# Altium footprint library UWRT Footprint Library.PcbLib: 258 footprints (part 11 of 17)
Each footprint in its own frame and in the unit in brackets; x right, y up, seen from the top. Pads: shape width x height; smd on the part's side, far side on the other; paste and mask are expansions set on the pad; w line width, h text height; cw(c..) or ccw(c..) is an arc to the next point about the centre after c.
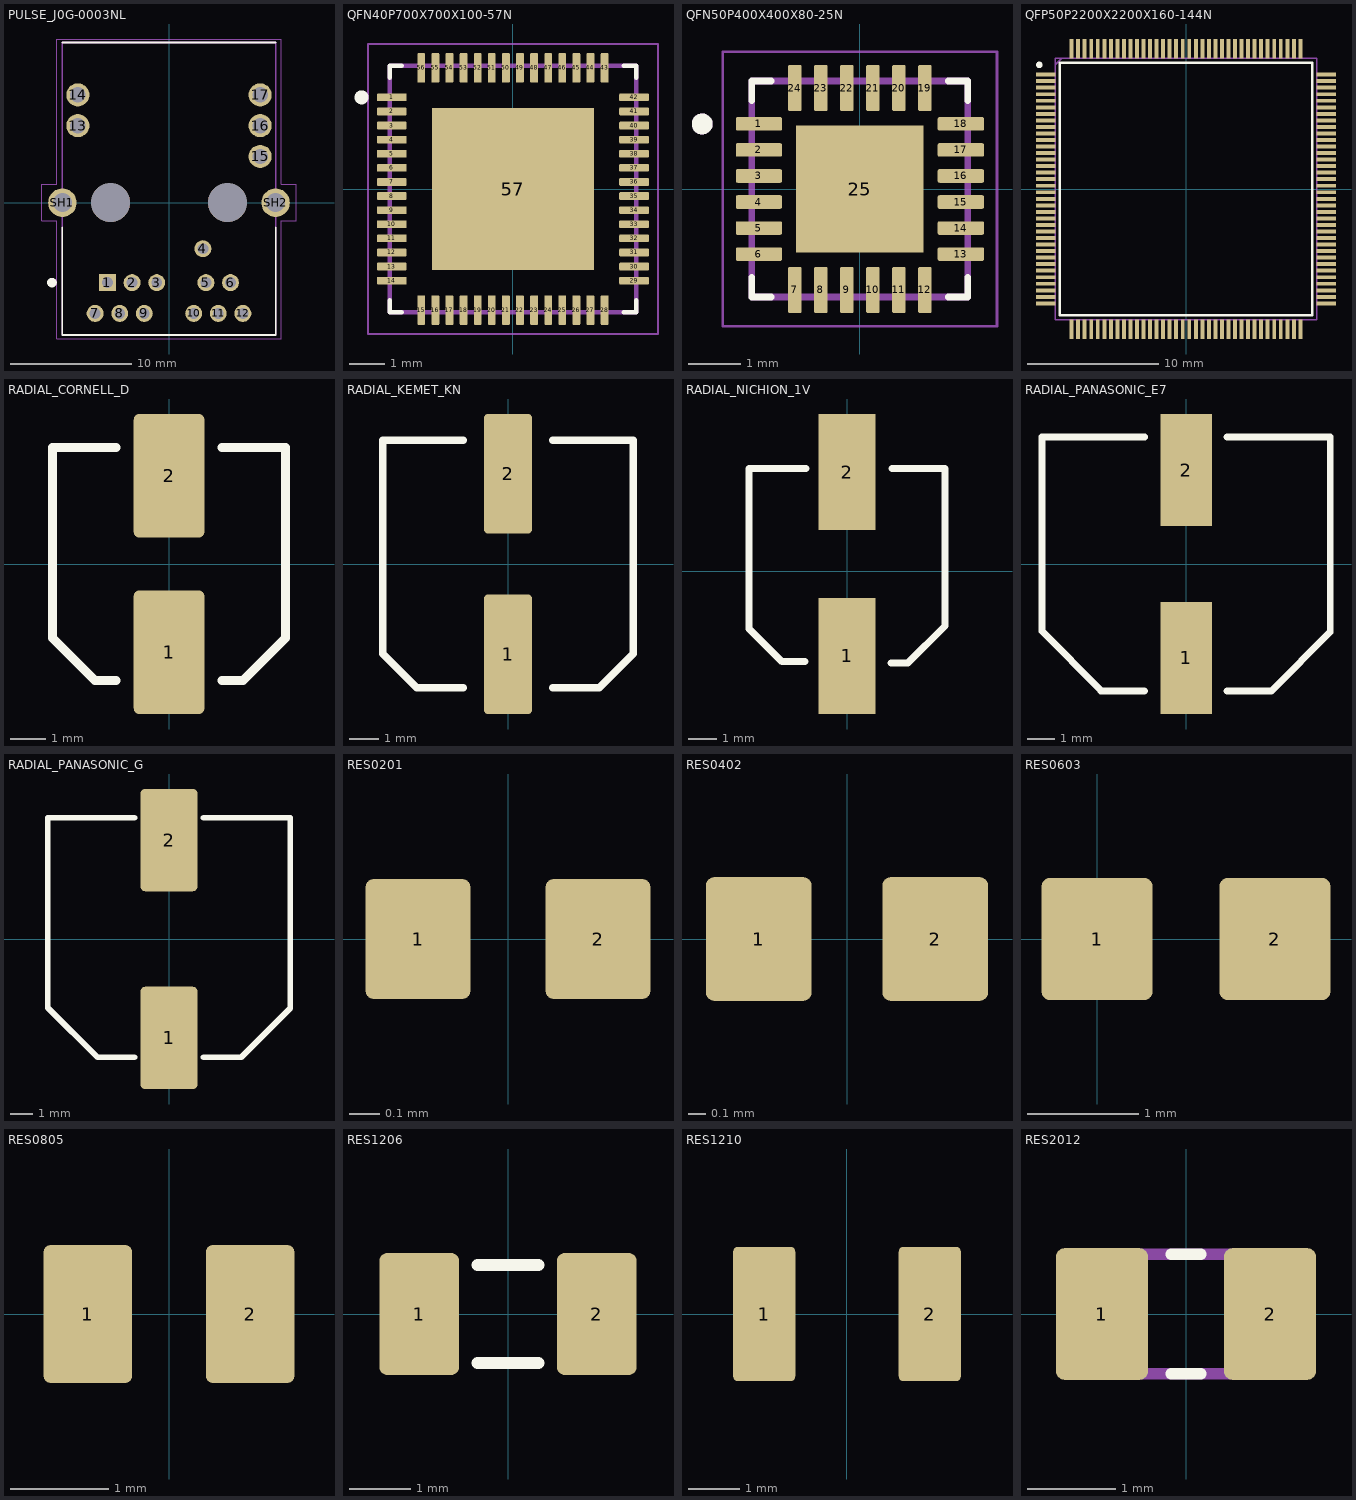
[diagram p10: the footprints below, top view; thin cyan lines are the x and y axes]

## PULSE_J0G-0003NL [mm]
pads (21):
  rect 1.398x1.398 hole 0.89: 1(-5.075,-6.6)
  round 1.398 hole 0.89: 2(-3.045,-6.6) 3(-1.015,-6.6) 4(2.8,-3.8) 5(3.045,-6.6) 6(5.075,-6.6) 7(-6.095,-9.14) 8(-4.065,-9.14) 9(-2.035,-9.14) 10(2.035,-9.14) 11(4.065,-9.14) 12(6.095,-9.14)
  round 1.905 hole 1.27: 13(-7.52,6.35) 14(-7.52,8.89) 15(7.52,3.81) 16(7.52,6.35) 17(7.52,8.89)
  round 2.355 hole 1.57: SH1(-8.79,0) SH2(8.79,0)
  round 3.2 hole 3.2 unplated: ""(-4.825,0) ""(4.825,0)
Top Overlay:
  circle w0.4: c-9.66,-6.6 r0.2
  lines w0.127: -8.79,-2.03 -8.79,-10.92 8.79,-10.92 8.79,-2.03 ; -8.79,13.21 8.79,13.21
Mechanical 13:
  lines w0.127: -8.79,-10.92 8.79,-10.92 8.79,13.21 -8.79,13.21 -8.79,-10.92
Mechanical 15:
  lines w0.05: -10.5,-1.5 -10.5,1.5 -9.25,1.5 -9.25,13.5 9.25,13.5 9.25,1.5 10.5,1.5 10.5,-1.5 9.25,-1.5 9.25,-11.25 -9.25,-11.25 -9.25,-1.5 -10.5,-1.5
3D body "J0G-0003NL--3DModel-STEP-1.STEP": height 11.31, standoff -3.55, extent -8.9,-10.58 9.08,13.98

## QFN40P700X700X100-57N [mm]
pads (57):
  rrect25% 0.84x0.22 smd: 1(-3.435,2.6) 2(-3.435,2.2) 3(-3.435,1.8) 4(-3.435,1.4) 5(-3.435,1) 6(-3.435,0.6) 7(-3.435,0.2) 8(-3.435,-0.2) 9(-3.435,-0.6) 10(-3.435,-1) 11(-3.435,-1.4) 12(-3.435,-1.8) 13(-3.435,-2.2) 14(-3.435,-2.6) 29(3.435,-2.6) 30(3.435,-2.2) 31(3.435,-1.8) 32(3.435,-1.4) 33(3.435,-1) 34(3.435,-0.6) 35(3.435,-0.2) 36(3.435,0.2) 37(3.435,0.6) 38(3.435,1) 39(3.435,1.4) 40(3.435,1.8) 41(3.435,2.2) 42(3.435,2.6)
  rrect25% 0.22x0.84 smd: 15(-2.6,-3.435) 16(-2.2,-3.435) 17(-1.8,-3.435) 18(-1.4,-3.435) 19(-1,-3.435) 20(-0.6,-3.435) 21(-0.2,-3.435) 22(0.2,-3.435) 23(0.6,-3.435) 24(1,-3.435) 25(1.4,-3.435) 26(1.8,-3.435) 27(2.2,-3.435) 28(2.6,-3.435) 43(2.6,3.435) 44(2.2,3.435) 45(1.8,3.435) 46(1.4,3.435) 47(1,3.435) 48(0.6,3.435) 49(0.2,3.435) 50(-0.2,3.435) 51(-0.6,3.435) 52(-1,3.435) 53(-1.4,3.435) 54(-1.8,3.435) 55(-2.2,3.435) 56(-2.6,3.435)
  rect 4.6x4.6 smd paste-3: 57(0,0)
Top Overlay:
  circle w0.2: c-4.295,2.6 r0.1
  lines w0.127: -3.5,-3.15 -3.5,-3.5 -3.15,-3.5 ; -3.5,3.15 -3.5,3.5 -3.15,3.5 ; 3.15,-3.5 3.5,-3.5 3.5,-3.15 ; 3.15,3.5 3.5,3.5 3.5,3.15
Top Paste:
  region: 1.45,-1.45 -1.45,-1.45 -1.45,1.45 1.45,1.45
Mechanical 13:
  lines w0.127: -3.5,-3.5 3.5,-3.5 3.5,3.5 -3.5,3.5 -3.5,-3.5
Mechanical 15:
  lines w0.05: -4.115,-4.115 4.115,-4.115 4.115,4.115 -4.115,4.115 -4.115,-4.115
3D body "2G.STEP": height 0.98, standoff -0.02, extent -3.498,-3.503 3.502,3.497

## QFN50P400X400X80-25N [mm]
pads (25):
  rrect25% 0.89x0.26 smd: 1(-1.94,1.25) 2(-1.94,0.75) 3(-1.94,0.25) 4(-1.94,-0.25) 5(-1.94,-0.75) 6(-1.94,-1.25) 13(1.94,-1.25) 14(1.94,-0.75) 15(1.94,-0.25) 16(1.94,0.25) 17(1.94,0.75) 18(1.94,1.25)
  rrect25% 0.26x0.89 smd: 7(-1.25,-1.94) 8(-0.75,-1.94) 9(-0.25,-1.94) 10(0.25,-1.94) 11(0.75,-1.94) 12(1.25,-1.94) 19(1.25,1.94) 20(0.75,1.94) 21(0.25,1.94) 22(-0.25,1.94) 23(-0.75,1.94) 24(-1.25,1.94)
  rect 2.45x2.45 smd paste-0.455: 25(0,0)
Top Overlay:
  circle w0.2: c-3.03,1.25 r0.1
  lines w0.127: -2.075,-1.7 -2.075,-2.075 -1.7,-2.075 ; -2.075,1.7 -2.075,2.075 -1.7,2.075 ; 1.7,-2.075 2.075,-2.075 2.075,-1.7 ; 1.7,2.075 2.075,2.075 2.075,1.7
Mechanical 13:
  circle w0.2: c-3.03,1.25 r0.1
  lines w0.127: -2.075,-2.075 -2.075,2.075 2.075,2.075 2.075,-2.075 -2.075,-2.075
Mechanical 15:
  lines w0.05: -2.635,-2.635 -2.635,2.635 2.635,2.635 2.635,-2.635 -2.635,-2.635
3D body "step_temp.STEP": height 0.8, standoff 0, extent -2,-2 2,2

## QFP50P2200X2200X160-144N [mm]
pads (144):
  rect 1.475x0.3 smd: 1(-10.738,8.75) 2(-10.738,8.25) 3(-10.738,7.75) 4(-10.738,7.25) 5(-10.738,6.75) 6(-10.738,6.25) 7(-10.738,5.75) 8(-10.738,5.25) 9(-10.738,4.75) 10(-10.738,4.25) 11(-10.738,3.75) 12(-10.738,3.25) 13(-10.738,2.75) 14(-10.738,2.25) 15(-10.738,1.75) 16(-10.738,1.25) 17(-10.738,0.75) 18(-10.738,0.25) 19(-10.738,-0.25) 20(-10.738,-0.75) 21(-10.738,-1.25) 22(-10.738,-1.75) 23(-10.738,-2.25) 24(-10.738,-2.75) 25(-10.738,-3.25) 26(-10.738,-3.75) 27(-10.738,-4.25) 28(-10.738,-4.75) 29(-10.738,-5.25) 30(-10.738,-5.75) 31(-10.738,-6.25) 32(-10.738,-6.75) 33(-10.738,-7.25) 34(-10.738,-7.75) 35(-10.738,-8.25) 36(-10.738,-8.75) 73(10.738,-8.75) 74(10.738,-8.25) 75(10.738,-7.75) 76(10.738,-7.25) 77(10.738,-6.75) 78(10.738,-6.25) 79(10.738,-5.75) 80(10.738,-5.25) 81(10.738,-4.75) 82(10.738,-4.25) 83(10.738,-3.75) 84(10.738,-3.25) 85(10.738,-2.75) 86(10.738,-2.25) 87(10.738,-1.75) 88(10.738,-1.25) 89(10.738,-0.75) 90(10.738,-0.25) 91(10.738,0.25) 92(10.738,0.75) 93(10.738,1.25) 94(10.738,1.75) 95(10.738,2.25) 96(10.738,2.75) 97(10.738,3.25) 98(10.738,3.75) 99(10.738,4.25) 100(10.738,4.75) 101(10.738,5.25) 102(10.738,5.75) 103(10.738,6.25) 104(10.738,6.75) 105(10.738,7.25) 106(10.738,7.75) 107(10.738,8.25) 108(10.738,8.75)
  rect 0.3x1.475 smd: 37(-8.75,-10.738) 38(-8.25,-10.738) 39(-7.75,-10.738) 40(-7.25,-10.738) 41(-6.75,-10.738) 42(-6.25,-10.738) 43(-5.75,-10.738) 44(-5.25,-10.738) 45(-4.75,-10.738) 46(-4.25,-10.738) 47(-3.75,-10.738) 48(-3.25,-10.738) 49(-2.75,-10.738) 50(-2.25,-10.738) 51(-1.75,-10.738) 52(-1.25,-10.738) 53(-0.75,-10.738) 54(-0.25,-10.738) 55(0.25,-10.738) 56(0.75,-10.738) 57(1.25,-10.738) 58(1.75,-10.738) 59(2.25,-10.738) 60(2.75,-10.738) 61(3.25,-10.738) 62(3.75,-10.738) 63(4.25,-10.738) 64(4.75,-10.738) 65(5.25,-10.738) 66(5.75,-10.738) 67(6.25,-10.738) 68(6.75,-10.738) 69(7.25,-10.738) 70(7.75,-10.738) 71(8.25,-10.738) 72(8.75,-10.738) 109(8.75,10.738) 110(8.25,10.738) 111(7.75,10.738) 112(7.25,10.738) 113(6.75,10.738) 114(6.25,10.738) 115(5.75,10.738) 116(5.25,10.738) 117(4.75,10.738) 118(4.25,10.738) 119(3.75,10.738) 120(3.25,10.738) 121(2.75,10.738) 122(2.25,10.738) 123(1.75,10.738) 124(1.25,10.738) 125(0.75,10.738) 126(0.25,10.738) 127(-0.25,10.738) 128(-0.75,10.738) 129(-1.25,10.738) 130(-1.75,10.738) 131(-2.25,10.738) 132(-2.75,10.738) 133(-3.25,10.738) 134(-3.75,10.738) 135(-4.25,10.738) 136(-4.75,10.738) 137(-5.25,10.738) 138(-5.75,10.738) 139(-6.25,10.738) 140(-6.75,10.738) 141(-7.25,10.738) 142(-7.75,10.738) 143(-8.25,10.738) 144(-8.75,10.738)
Top Overlay:
  circle w0.25: c-11.225,9.5 r0.125
  lines w0.2: -9.65,-9.65 -9.65,9.65 9.65,9.65 9.65,-9.65 -9.65,-9.65
Mechanical 13:
  lines w0.1: -10,9.5 -9.5,10 ; -10,-10 -10,10 10,10 10,-10 -10,-10
3D body "STM32F446ZCT6JTR.stp": height 1.6, standoff 0, extent -11,-11 11,11

## RADIAL_CORNELL_D [mm] "Size D radial surface mount capacitor"
pads (2):
  rrect15% 2x3.5 smd: 1(0,-2.5) 2(0,2.5)
Top Overlay:
  lines w0.254: -1.5,-3.3 -2.1,-3.3 -3.3,-2.1 -3.3,3.3 -1.5,3.3 ; 1.5,-3.3 2.1,-3.3 3.3,-2.1 3.3,3.3 1.5,3.3
3D body "RADIAL_CORNELL_D.STEP": height 5.9, standoff 0, extent -3.3,-3.625 3.3,3.675

## RADIAL_KEMET_KN [mm]
pads (2):
  rrect15% 1.6x4 smd: 1(0,-3.025) 2(0,3.025)
Top Overlay:
  lines w0.254: -4.2,4.15 -4.2,-3 -3.05,-4.15 -1.5,-4.15 ; -4.15,4.15 -1.5,4.15 ; 1.5,-4.15 3,-4.15 ; 1.5,4.15 4.2,4.15 4.2,-3 3.05,-4.15
3D body "RADIAL_PANASONIC_F.STEP": height 10.2, standoff 0, extent -4.15,-4.95 4.15,4.95

## RADIAL_NICHION_1V [mm] "Size G radial surface mount capacitor"
pads (2):
  rect 2x4.1 smd: 1(0,-3) 2(0,3.5)
Top Overlay:
  lines w0.254: -3.459,-1.356 -3.459,-2.041 ; -2.943,-2.557 -3.459,-2.041 ; -1.485,-3.2 -2.3,-3.2 -3.459,-2.041 ; -1.46,3.625 -3.459,3.625 -3.459,-2.041 ; 1.563,-3.25 2.15,-3.25 3.459,-1.941 ; 1.587,3.625 3.459,3.625 3.459,-1.941 ; 3.3,-2.1 3.459,-1.941 ; 3.459,-1.675 3.459,-1.941
3D body "UUD1V680MCL1GS.STEP": height 7.95, standoff -0.05, extent -3.4,-3.3 3.2,3.7

## RADIAL_PANASONIC_E7 [mm] "Size E7 radial surface mount capacitor"
pads (2):
  rect 1.9x4.15 smd: 1(0,-3.475) 2(0,3.475)
Top Overlay:
  lines w0.254: -5.34,4.7 -1.53,4.7 ; -5.338,-2.487 -3.154,-4.671 ; -5.334,-2.487 -5.334,4.7 ; -3.159,-4.7 -1.533,-4.7 ; 1.515,-4.7 3.166,-4.7 ; 1.518,4.7 5.328,4.7 ; 3.171,-4.671 5.33,-2.512 ; 5.334,-2.512 5.334,4.7

## RADIAL_PANASONIC_G [mm] "Size G radial surface mount capacitor"
pads (2):
  rrect15% 2.5x4.5 smd: 1(0,-4.35) 2(0,4.35)
Top Overlay:
  lines w0.254: -1.524,-5.207 -3.15,-5.207 -5.334,-3.023 -5.334,5.334 -1.524,5.334 ; 1.524,-5.207 3.175,-5.207 5.334,-3.048 5.334,5.334 1.524,5.334
3D body "User Library-capacitor size G.step": height 10.21, standoff -0.01, extent -5.15,-5.8 5.15,5.8

## RES0201 [mm] "Chip Resistor, Body 0.6x0.3mm, IPC Medium Density"
pads (2):
  rrect15% 0.35x0.4 smd: 1(-0.3,0) 2(0.3,0)
3D body "RES0201.step": height 0.22, standoff -0.02, extent -0.3,-0.15 0.3,0.15

## RES0402 [mm] "Chip Resistor, Body 1x0.5mm, IPC Medium Density"
pads (2):
  rrect15% 0.6x0.7 smd: 1(-0.5,0) 2(0.5,0)
3D body "User Library-R SMD 0402.STEP": height 0.27, standoff -0.08, extent -0.5,-0.25 0.5,0.25

## RES0603 [mm] "Chip Resistor, Body 1.6x0.8mm, IPC Medium Density"
height 0.6
pads (2):
  rrect15% 1x1.1 smd: 1(0,0) 2(1.6,0)
3D body "0603.step": height 0.46, standoff 0.01, extent 0,-0.4 1.6,0.4

## RES0805 [mm] "Chip Resistor, 2-Leads, Body 2.00x1.25mm, IPC High Density"
height 0.5
pads (2):
  rrect15% 0.9x1.4 smd: 1(-0.825,0) 2(0.825,0)
3D body "0805 resistor.step": height 0.61, standoff 0.01, extent -1,-0.625 1,0.625

## RES1206 [mm] "Chip Resistor, Body 3.2x1.6mm, IPC Medium Density"
height 0.75
pads (2):
  rrect20% 1.3x2 smd: 1(-1.45,0) 2(1.45,0)
Top Overlay:
  lines w0.2: -0.5,-0.8 0.5,-0.8 ; -0.5,0.8 0.5,0.8
3D body "1206 resistor.step": height 0.61, standoff 0.01, extent -1.6,-0.8 1.6,0.8

## RES1210 [mm] "Chip Resistor, Body 3.20x2.50mm"
pads (2):
  rrect15% 1.2x2.6 smd: 1(-1.6,0) 2(1.6,0)
3D body "User Library-R_1210.sldprt": height 0.6, standoff 0, extent -1.6,-1.25 1.6,1.25

## RES2012 [mm]
pads (2):
  rrect20% 1.05x1.5 smd: 1(-0.955,0) 2(0.955,0)
Top Overlay:
  lines w0.127: -0.17,-0.68 0.17,-0.68 ; -0.17,0.68 0.17,0.68
Mechanical 4:
  lines w0.127: -1.05,-0.68 -1.05,0.68 ; -1.05,-0.68 1.05,-0.68 ; -1.05,-0.68 -1.05,0.68 ; -1.05,-0.68 1.05,-0.68 ; -1.05,0.68 1.05,0.68 ; -1.05,0.68 1.05,0.68 ; 1.05,-0.68 1.05,0.68 ; 1.05,-0.68 1.05,0.68
3D body "0805 resistor.STEP": height 0.6, standoff 0, extent -1,-0.625 1,0.625